# Altium footprint library Stabiliser.PcbLib: 128 footprints (part 1 of 8)
Each footprint in its own frame and in the unit in brackets; x right, y up, seen from the top. Pads: shape width x height; smd on the part's side, far side on the other; paste and mask are expansions set on the pad; w line width, h text height; cw(c..) or ccw(c..) is an arc to the next point about the centre after c.
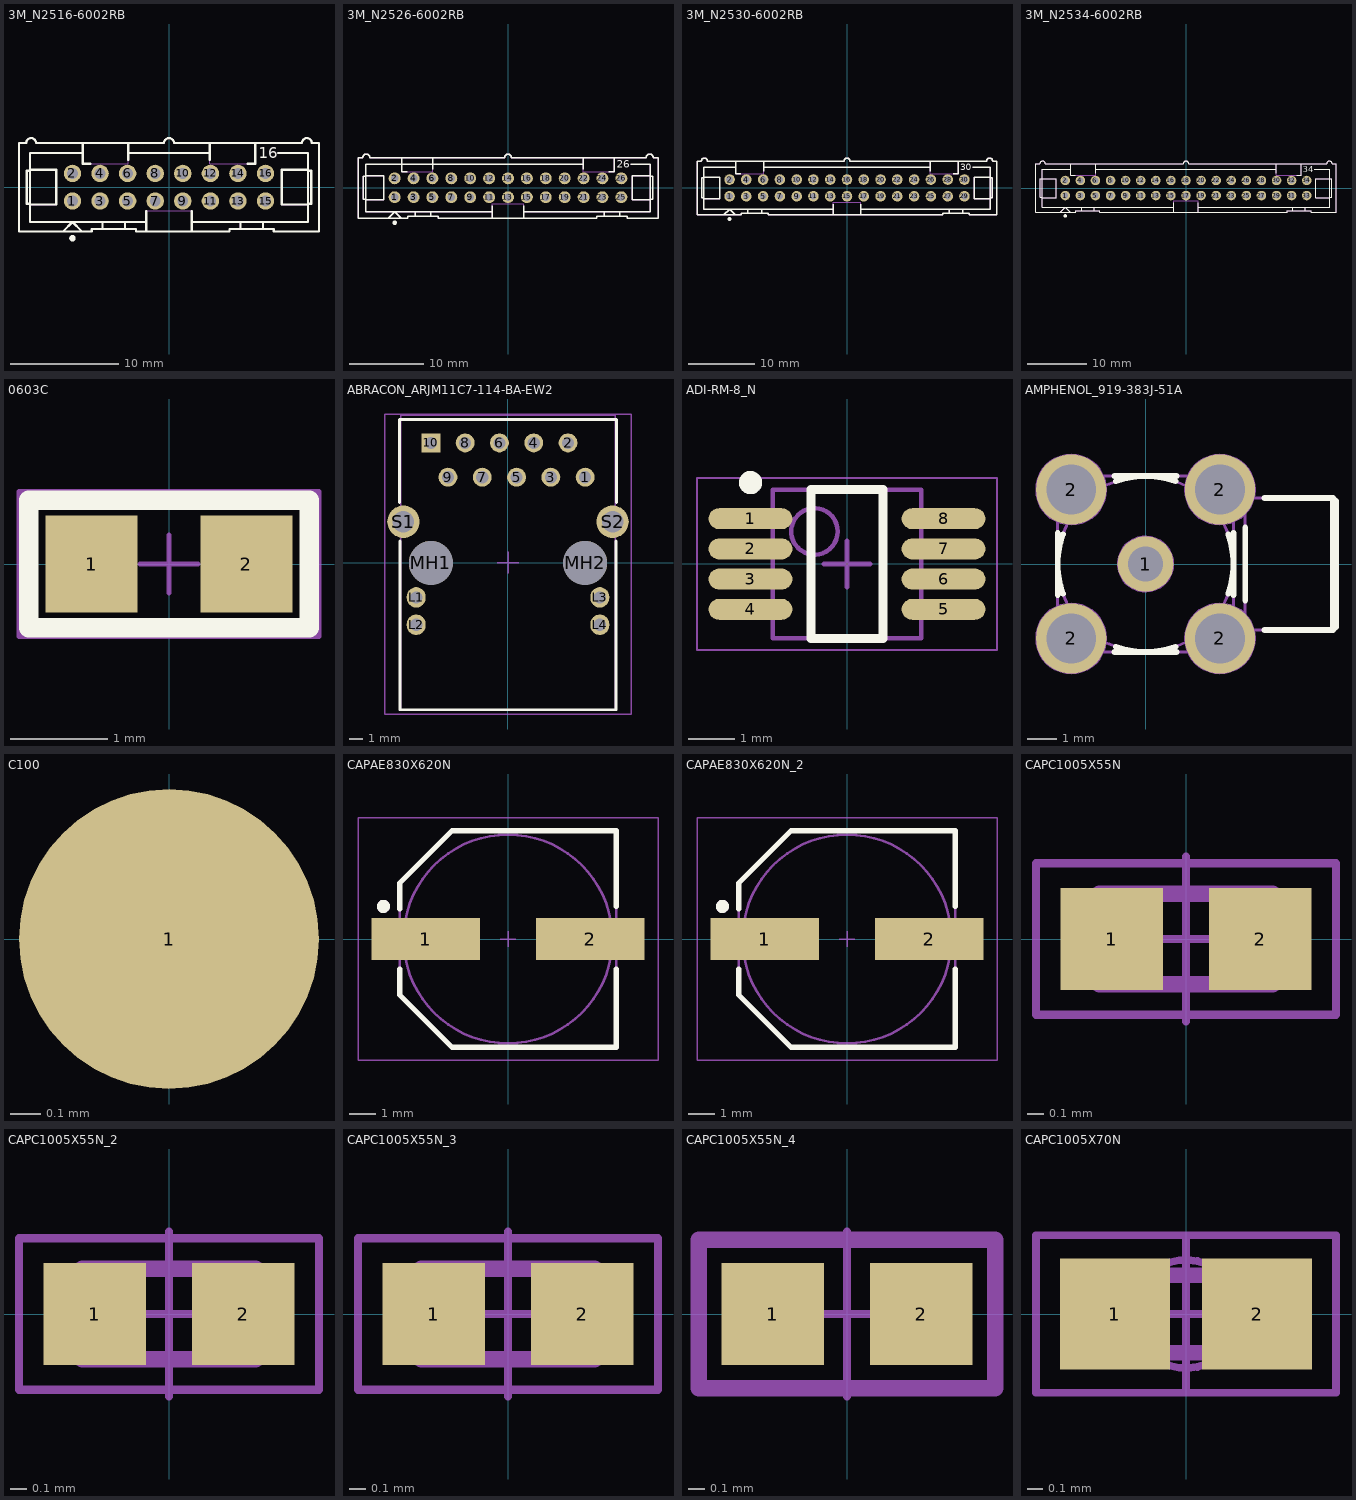
[diagram p0: the footprints below, top view; thin cyan lines are the x and y axes]

## 3M_N2516-6002RB [mm] "16 Contacts - Straight .100\" x .100\" Low Profile Four-Wall Header"
height 9.91
pads (16):
  round 1.6 hole 1: 1(-8.89,-1.27) 2(-8.89,1.27) 3(-6.35,-1.27) 4(-6.35,1.27) 5(-3.81,-1.27) 6(-3.81,1.27) 7(-1.27,-1.27) 8(-1.27,1.27) 9(1.27,-1.27) 10(1.27,1.27) 11(3.81,-1.27) 12(3.81,1.27) 13(6.35,-1.27) 14(6.35,1.27) 15(8.89,-1.27) 16(8.89,1.27)
Top Overlay:
  circle w0.3: c-8.89,-4.699 r0.15
  lines w0.2: -12.802,-1.603 -10.389,-1.603 -10.389,1.603 -12.802,1.603 ; -12.802,-1.524 -13.106,-1.524 -13.106,1.524 -12.802,1.524 ; -9.754,-4.064 -8.89,-3.2 -8.026,-4.064 ; -7.938,3.15 -12.802,3.15 -12.802,-3.2 -2.096,-3.2 ; -7.938,4.064 -7.938,2.159 -7.229,2.159 ; -6.121,-3.835 -6.121,-3.2 ; -4.039,-3.835 -4.039,-3.2 ; -3.747,2.518 -3.747,4.064 ; -3.747,3.15 3.747,3.15 ; -2.096,-4.064 -2.096,-2.209 ; 2.095,-4.064 2.095,-2.209 ; 2.095,-3.2 12.802,-3.2 12.802,3.15 10.033,3.15 ; 3.747,2.518 3.747,4.064 ; 6.579,-3.835 6.579,-3.2 ; 7.229,2.159 7.938,2.159 7.938,4.064 ; 8.661,-3.835 8.661,-3.2 ; 12.802,-1.603 10.389,-1.603 10.389,1.603 12.802,1.603 ; 12.802,-1.524 13.106,-1.524 13.106,1.524 12.802,1.524 ; -13.818,-4.064 -13.818,4.064 -13.157,4.064 cw(c-12.7,4.064) -12.243,4.064 -0.457,4.064 cw(c0,4.064) 0.457,4.064 12.243,4.064 cw(c12.7,4.064) 13.157,4.064 13.818,4.064 13.818,-4.064 9.652,-4.064 9.652,-3.835 5.588,-3.835 5.588,-4.064 -3.048,-4.064 -3.048,-3.835 -7.112,-3.835 -7.112,-4.064 -13.818,-4.064
  text "16" at 8.255,2.667 h1.02
Mechanical 14:
  lines w0.1: -12.802,-1.603 -10.389,-1.603 -10.389,1.603 -12.802,1.603 ; -12.802,-1.524 -13.106,-1.524 -13.106,1.524 -12.802,1.524 ; -9.754,-4.064 -8.89,-3.2 -8.026,-4.064 ; -7.938,3.15 -12.802,3.15 -12.802,-3.2 -2.096,-3.2 ; -7.938,4.064 -7.938,2.159 -3.747,2.159 -3.747,4.064 ; -6.121,-3.835 -6.121,-3.2 ; -4.039,-3.835 -4.039,-3.2 ; -3.747,3.15 3.747,3.15 ; -2.096,-4.064 -2.096,-2.159 2.095,-2.159 2.095,-4.064 ; 2.095,-3.2 12.802,-3.2 12.802,3.15 10.033,3.15 ; 3.747,4.064 3.747,2.159 7.938,2.159 7.938,4.064 ; 6.579,-3.835 6.579,-3.2 ; 8.661,-3.835 8.661,-3.2 ; 12.802,-1.603 10.389,-1.603 10.389,1.603 12.802,1.603 ; 12.802,-1.524 13.106,-1.524 13.106,1.524 12.802,1.524 ; -13.818,-4.064 -13.818,4.064 -13.157,4.064 cw(c-12.7,4.064) -12.243,4.064 -0.457,4.064 cw(c0,4.064) 0.457,4.064 12.243,4.064 cw(c12.7,4.064) 13.157,4.064 13.818,4.064 13.818,-4.064 9.652,-4.064 9.652,-3.835 5.588,-3.835 5.588,-4.064 -3.048,-4.064 -3.048,-3.835 -7.112,-3.835 -7.112,-4.064 -13.818,-4.064
  text "16" at 8.255,2.667 h1.02
3D body "3M_N2516-6002RB.stp": height 9.65, standoff -2.84, extent -13.817,-4.166 13.818,4.521

## 3M_N2526-6002RB [mm] "26 Contacts - Straight .100\" x .100\" Low Profile Four-Wall Header"
height 9.91
pads (26):
  round 1.6 hole 1: 1(-15.24,-1.27) 2(-15.24,1.27) 3(-12.7,-1.27) 4(-12.7,1.27) 5(-10.16,-1.27) 6(-10.16,1.27) 7(-7.62,-1.27) 8(-7.62,1.27) 9(-5.08,-1.27) 10(-5.08,1.27) 11(-2.54,-1.27) 12(-2.54,1.27) 13(0,-1.27) 14(0,1.27) 15(2.54,-1.27) 16(2.54,1.27) 17(5.08,-1.27) 18(5.08,1.27) 19(7.62,-1.27) 20(7.62,1.27) 21(10.16,-1.27) 22(10.16,1.27) 23(12.7,-1.27) 24(12.7,1.27) 25(15.24,-1.27) 26(15.24,1.27)
Top Overlay:
  circle w0.3: c-15.24,-4.699 r0.15
  lines w0.2: -19.152,-1.603 -16.739,-1.603 -16.739,1.603 -19.152,1.603 ; -19.152,-1.524 -19.456,-1.524 -19.456,1.524 -19.152,1.524 ; -16.104,-4.064 -15.24,-3.2 -14.376,-4.064 ; -14.288,3.15 -19.152,3.15 ; -14.288,4.064 -14.288,2.159 -13.579,2.159 ; -12.471,-3.835 -12.471,-3.2 ; -10.389,-3.835 -10.389,-3.2 ; -10.097,2.518 -10.097,4.064 ; -2.096,-4.064 -2.096,-2.438 ; -2.096,-3.2 -19.152,-3.2 -19.152,3.15 ; 2.095,-4.064 2.095,-2.438 ; 2.095,-3.2 19.152,-3.2 19.152,3.15 16.51,3.15 ; 10.097,2.518 10.097,4.064 ; 10.097,3.15 -19.152,3.15 ; 12.929,-3.835 12.929,-3.2 ; 13.579,2.159 14.288,2.159 14.288,4.064 ; 15.011,-3.835 15.011,-3.2 ; 19.152,-1.603 16.739,-1.603 16.739,1.603 19.152,1.603 ; 19.152,-1.524 19.456,-1.524 19.456,1.524 19.152,1.524 ; -20.168,-4.064 -13.462,-4.064 -13.462,-3.835 -9.398,-3.835 -9.398,-4.064 11.938,-4.064 11.938,-3.835 16.002,-3.835 16.002,-4.064 20.168,-4.064 20.168,4.064 19.507,4.064 ccw(c19.05,4.064) 18.593,4.064 0.457,4.064 ccw(c0,4.064) -0.457,4.064 -18.593,4.064 ccw(c-19.05,4.064) -19.507,4.064 -20.168,4.064 -20.168,-4.064
  text "26" at 14.605,2.667 h1.02
Mechanical 14:
  lines w0.1: -19.152,-1.603 -16.739,-1.603 -16.739,1.603 -19.152,1.603 ; -19.152,-1.524 -19.456,-1.524 -19.456,1.524 -19.152,1.524 ; -16.104,-4.064 -15.24,-3.2 -14.376,-4.064 ; -14.288,3.15 -19.152,3.15 ; -14.288,4.064 -14.288,2.159 -10.097,2.159 -10.097,4.064 ; -12.471,-3.835 -12.471,-3.2 ; -10.389,-3.835 -10.389,-3.2 ; -2.096,-4.064 -2.096,-2.159 2.095,-2.159 2.095,-4.064 ; -2.096,-3.2 -19.152,-3.2 -19.152,3.15 ; 2.095,-3.2 19.152,-3.2 19.152,3.15 16.51,3.15 ; 10.097,3.15 -19.152,3.15 ; 10.097,4.064 10.097,2.159 14.288,2.159 14.288,4.064 ; 12.929,-3.835 12.929,-3.2 ; 15.011,-3.835 15.011,-3.2 ; 19.152,-1.603 16.739,-1.603 16.739,1.603 19.152,1.603 ; 19.152,-1.524 19.456,-1.524 19.456,1.524 19.152,1.524 ; -20.168,-4.064 -13.462,-4.064 -13.462,-3.835 -9.398,-3.835 -9.398,-4.064 11.938,-4.064 11.938,-3.835 16.002,-3.835 16.002,-4.064 20.168,-4.064 20.168,4.064 19.507,4.064 ccw(c19.05,4.064) 18.593,4.064 0.457,4.064 ccw(c0,4.064) -0.457,4.064 -18.593,4.064 ccw(c-19.05,4.064) -19.507,4.064 -20.168,4.064 -20.168,-4.064
  text "26" at 14.605,2.667 h1.02
3D body "3M_N2526-6002RB.stp": height 9.91, standoff -2.84, extent -20.167,-4.115 20.168,4.521

## 3M_N2530-6002RB [mm] "30 Contacts - Straight .100\" x .100\" Low Profile Four-Wall Header"
height 9.91
pads (30):
  round 1.6 hole 1: 1(-17.78,-1.27) 2(-17.78,1.27) 3(-15.24,-1.27) 4(-15.24,1.27) 5(-12.7,-1.27) 6(-12.7,1.27) 7(-10.16,-1.27) 8(-10.16,1.27) 9(-7.62,-1.27) 10(-7.62,1.27) 11(-5.08,-1.27) 12(-5.08,1.27) 13(-2.54,-1.27) 14(-2.54,1.27) 15(0,-1.27) 16(0,1.27) 17(2.54,-1.27) 18(2.54,1.27) 19(5.08,-1.27) 20(5.08,1.27) 21(7.62,-1.27) 22(7.62,1.27) 23(10.16,-1.27) 24(10.16,1.27) 25(12.7,-1.27) 26(12.7,1.27) 27(15.24,-1.27) 28(15.24,1.27) 29(17.78,-1.27) 30(17.78,1.27)
Top Overlay:
  circle w0.3: c-17.78,-4.699 r0.15
  lines w0.2: -21.692,-1.603 -19.279,-1.603 -19.279,1.603 -21.692,1.603 ; -21.692,-1.524 -21.996,-1.524 -21.996,1.524 -21.692,1.524 ; -18.644,-4.064 -17.78,-3.2 -16.916,-4.064 ; -16.828,3.15 -21.692,3.15 -21.692,-3.2 -2.096,-3.2 ; -16.828,4.064 -16.828,2.159 -16.119,2.159 ; -15.011,-3.835 -15.011,-3.2 ; -12.929,-3.835 -12.929,-3.2 ; -12.637,2.518 -12.637,4.064 ; -12.637,3.15 12.637,3.15 ; -2.096,-4.064 -2.096,-2.438 ; 2.095,-4.064 2.095,-2.438 ; 2.095,-3.2 21.692,-3.2 21.692,3.15 19.05,3.15 ; 12.637,2.518 12.637,4.064 ; 15.469,-3.835 15.469,-3.2 ; 16.119,2.159 16.828,2.159 16.828,4.064 ; 17.551,-3.835 17.551,-3.2 ; 21.692,-1.603 19.279,-1.603 19.279,1.603 21.692,1.603 ; 21.692,-1.524 21.996,-1.524 21.996,1.524 21.692,1.524 ; -22.708,-4.064 -22.708,4.064 -22.047,4.064 cw(c-21.59,4.064) -21.133,4.064 -0.457,4.064 cw(c0,4.064) 0.457,4.064 21.133,4.064 cw(c21.59,4.064) 22.047,4.064 22.708,4.064 22.708,-4.064 18.542,-4.064 18.542,-3.835 14.478,-3.835 14.478,-4.064 -11.938,-4.064 -11.938,-3.835 -16.002,-3.835 -16.002,-4.064 -22.708,-4.064
  text "30" at 17.145,2.667 h1.02
Mechanical 14:
  lines w0.1: -21.692,-1.603 -19.279,-1.603 -19.279,1.603 -21.692,1.603 ; -21.692,-1.524 -21.996,-1.524 -21.996,1.524 -21.692,1.524 ; -18.644,-4.064 -17.78,-3.2 -16.916,-4.064 ; -16.828,3.15 -21.692,3.15 -21.692,-3.2 -2.096,-3.2 ; -16.828,4.064 -16.828,2.159 -12.637,2.159 -12.637,4.064 ; -15.011,-3.835 -15.011,-3.2 ; -12.929,-3.835 -12.929,-3.2 ; -12.637,3.15 12.637,3.15 ; -2.096,-4.064 -2.096,-2.159 2.095,-2.159 2.095,-4.064 ; 2.095,-3.2 21.692,-3.2 21.692,3.15 19.05,3.15 ; 12.637,4.064 12.637,2.159 16.828,2.159 16.828,4.064 ; 15.469,-3.835 15.469,-3.2 ; 17.551,-3.835 17.551,-3.2 ; 21.692,-1.603 19.279,-1.603 19.279,1.603 21.692,1.603 ; 21.692,-1.524 21.996,-1.524 21.996,1.524 21.692,1.524 ; -22.708,-4.064 -22.708,4.064 -22.047,4.064 cw(c-21.59,4.064) -21.133,4.064 -0.457,4.064 cw(c0,4.064) 0.457,4.064 21.133,4.064 cw(c21.59,4.064) 22.047,4.064 22.708,4.064 22.708,-4.064 18.542,-4.064 18.542,-3.835 14.478,-3.835 14.478,-4.064 -11.938,-4.064 -11.938,-3.835 -16.002,-3.835 -16.002,-4.064 -22.708,-4.064
  text "30" at 17.145,2.667 h1.02
3D body "3M_N2530-6002RB.stp": height 9.91, standoff -2.84, extent -22.707,-4.115 22.708,4.521

## 3M_N2534-6002RB [mm] "34 Contacts - Straight .100\" x .100\" Low Profile Four-Wall Header"
height 9.91
pads (34):
  round 1.6 hole 1: 1(-20.32,-1.27) 2(-20.32,1.27) 3(-17.78,-1.27) 4(-17.78,1.27) 5(-15.24,-1.27) 6(-15.24,1.27) 7(-12.7,-1.27) 8(-12.7,1.27) 9(-10.16,-1.27) 10(-10.16,1.27) 11(-7.62,-1.27) 12(-7.62,1.27) 13(-5.08,-1.27) 14(-5.08,1.27) 15(-2.54,-1.27) 16(-2.54,1.27) 17(0,-1.27) 18(0,1.27) 19(2.54,-1.27) 20(2.54,1.27) 21(5.08,-1.27) 22(5.08,1.27) 23(7.62,-1.27) 24(7.62,1.27) 25(10.16,-1.27) 26(10.16,1.27) 27(12.7,-1.27) 28(12.7,1.27) 29(15.24,-1.27) 30(15.24,1.27) 31(17.78,-1.27) 32(17.78,1.27) 33(20.32,-1.27) 34(20.32,1.27)
Top Overlay:
  circle w0.3: c-20.32,-4.699 r0.15
  lines w0.2: -24.232,-1.603 -21.819,-1.603 -21.819,1.603 -24.232,1.603 ; -24.232,-1.524 -24.536,-1.524 -24.536,1.524 -24.232,1.524 ; -21.184,-4.064 -20.32,-3.2 -19.456,-4.064 ; -19.368,3.15 -24.232,3.15 -24.232,-3.2 -2.096,-3.2 ; -19.368,4.064 -19.368,2.159 -18.659,2.159 ; -17.551,-3.835 -17.551,-3.2 ; -15.469,-3.835 -15.469,-3.2 ; -15.177,2.518 -15.177,4.064 ; -15.177,3.15 15.177,3.15 ; -2.096,-4.064 -2.096,-2.438 ; 2.095,-4.064 2.095,-2.438 ; 2.095,-3.2 24.232,-3.2 24.232,3.15 21.59,3.15 ; 15.177,2.518 15.177,4.064 ; 18.009,-3.835 18.009,-3.2 ; 18.659,2.159 19.368,2.159 19.368,4.064 ; 20.091,-3.835 20.091,-3.2 ; 24.232,-1.603 21.819,-1.603 21.819,1.603 24.232,1.603 ; 24.232,-1.524 24.536,-1.524 24.536,1.524 24.232,1.524 ; -25.248,-4.064 -25.248,4.064 -24.587,4.064 cw(c-24.13,4.064) -23.673,4.064 -0.457,4.064 cw(c0,4.064) 0.457,4.064 23.673,4.064 cw(c24.13,4.064) 24.587,4.064 25.248,4.064 25.248,-4.064 21.082,-4.064 21.082,-3.835 17.018,-3.835 17.018,-4.064 -14.478,-4.064 -14.478,-3.835 -18.542,-3.835 -18.542,-4.064 -25.248,-4.064
  text "34" at 19.685,2.667 h1.02
Mechanical 14:
  lines w0.1: -24.232,-1.603 -21.819,-1.603 -21.819,1.603 -24.232,1.603 ; -24.232,-1.524 -24.536,-1.524 -24.536,1.524 -24.232,1.524 ; -21.184,-4.064 -20.32,-3.2 -19.456,-4.064 ; -19.368,3.15 -24.232,3.15 -24.232,-3.2 -2.096,-3.2 ; -19.368,4.064 -19.368,2.159 -15.177,2.159 -15.177,4.064 ; -17.551,-3.835 -17.551,-3.2 ; -15.469,-3.835 -15.469,-3.2 ; -15.177,3.15 15.177,3.15 ; -2.096,-4.064 -2.096,-2.159 2.095,-2.159 2.095,-4.064 ; 2.095,-3.2 24.232,-3.2 24.232,3.15 21.59,3.15 ; 15.177,4.064 15.177,2.159 19.368,2.159 19.368,4.064 ; 18.009,-3.835 18.009,-3.2 ; 20.091,-3.835 20.091,-3.2 ; 24.232,-1.603 21.819,-1.603 21.819,1.603 24.232,1.603 ; 24.232,-1.524 24.536,-1.524 24.536,1.524 24.232,1.524 ; -25.248,-4.064 -25.248,4.064 -24.587,4.064 cw(c-24.13,4.064) -23.673,4.064 -0.457,4.064 cw(c0,4.064) 0.457,4.064 23.673,4.064 cw(c24.13,4.064) 24.587,4.064 25.248,4.064 25.248,-4.064 21.082,-4.064 21.082,-3.835 17.018,-3.835 17.018,-4.064 -14.478,-4.064 -14.478,-3.835 -18.542,-3.835 -18.542,-4.064 -25.248,-4.064
  text "34" at 19.685,2.667 h1.02
3D body "3M_N2534-6002RB.stp": height 9.91, standoff -2.84, extent -25.247,-4.115 25.248,4.521

## 0603C [mm]
height 10.94
pads (2):
  rect 0.95x1 smd: 1(-0.8,0) 2(0.8,0)
Top Overlay:
  lines w0.203: -1.448,-0.66 -1.448,0.66 1.448,0.66 1.448,-0.66 -1.448,-0.66
Mechanical 14:
  lines w0.1: -1.45,-0.65 -1.45,0.65 1.45,0.65 1.45,-0.65 -1.45,-0.65
Mechanical 15:
  lines w0.05: -0.3,0 0.3,0 ; 0,-0.3 0,0.3 ; -1.55,-0.75 1.55,-0.75 1.55,0.75 -1.55,0.75 -1.55,-0.75
3D body "CAPC1608X87N.stp": height 0.87, standoff 0, extent -0.875,-0.475 0.875,0.475

## ABRACON_ARJM11C7-114-BA-EW2 [mm] "LAN Transformer, body 21.84x15.88mm"
height 13.95
pads (18):
  round 1.4 hole 0.9: 1(5.715,6.35) 2(4.445,8.89) 3(3.175,6.35) 4(1.905,8.89) 5(0.635,6.35) 6(-0.635,8.89) 7(-1.905,6.35) 8(-3.175,8.89) 9(-4.445,6.35)
  rect 1.4x1.4 hole 0.9: 10(-5.715,8.89)
  oval 1.4x1.52 hole 0.9: L1(-6.8,-2.55) L2(-6.8,-4.58) L3(6.8,-2.55) L4(6.8,-4.58)
  round 3.25 hole 3.25 unplated: MH1(-5.715,0) MH2(5.715,0)
  round 2.4 hole 1.6: S1(-7.745,3.05) S2(7.745,3.05)
Top Overlay:
  lines w0.2: -8.04,4.47 -8.04,10.63 8.04,10.63 8.04,4.47 ; -8,1.63 -8,-10.87 8,-10.87 8,1.63
Mechanical 11:
  lines w0.1: -7.94,-10.89 -7.94,10.95 7.94,10.95 7.94,-10.89 -7.94,-10.89
  text ".Designator" at 0,0.03 h1
Mechanical 13:
  lines w0.1: -7.94,-10.89 7.94,-10.89 7.94,10.63 -7.94,10.63 -7.94,-10.89
Mechanical 15:
  lines w0.1: -0.8,0.03 0.8,0.03 ; 0,-0.77 0,0.83 ; -9.145,-11.19 9.145,-11.19 9.145,11.03 -9.145,11.03 -9.145,-11.19
3D body "ARJ11C-MBSAT-A-B-3MU2.STEP": height 16.15, standoff -3.29, extent -10.327,-10.871 10.328,10.63

## ADI-RM-8_N [mm] "SOP, 8-Leads, Body 3x3mm, Pitch 0.65mm, IPC Medium Density"
height 1.1
pads (8):
  oval 1.8x0.45 smd: 1(-2.075,0.975) 2(-2.075,0.325) 3(-2.075,-0.325) 4(-2.075,-0.975) 5(2.075,-0.975) 6(2.075,-0.325) 7(2.075,0.325) 8(2.075,0.975)
Top Overlay:
  circle w0.25: c-2.075,1.75 r0.125
  lines w0.2: -0.775,-1.6 0.775,-1.6 0.775,1.6 -0.775,1.6 -0.775,-1.6
Mechanical 13:
  circle w0.1: c-0.7,0.7 r0.5
  lines w0.1: -1.6,-1.6 1.6,-1.6 1.6,1.6 -1.6,1.6 -1.6,-1.6
Mechanical 15:
  lines w0.05: -3.225,-1.85 3.225,-1.85 3.225,1.85 -3.225,1.85 -3.225,-1.85
  lines w0.1: -0.5,0 0.5,0 ; 0,-0.5 0,0.5
3D body: height 1.1, standoff 0, extent -1.6,-1.6 1.6,1.6

## AMPHENOL_919-383J-51A [mm] "50 Ohm, RF Connector, MCX Right Angle PCB Receptacle Jack"
height 6
pads (5):
  round 1.9 hole 1.2: 1(0,0)
  round 2.4 hole 1.7: 2(-2.54,-2.54) 2(-2.54,2.54) 2(2.54,-2.54) 2(2.54,2.54)
Top Overlay:
  lines w0.2: -3,-1.06 -3,1.06 ; -2.823,-1.016 cw(c0,0) -2.823,1.016 ; -1.06,-3 1.06,-3 ; -1.06,3 1.06,3 ; -1.016,-2.823 ccw(c0,0) 1.016,-2.823 ; -1.016,2.823 cw(c0,0) 1.016,2.823 ; 2.823,-1.016 ccw(c0,0) 2.823,1.016 ; 3,-1.06 3,1.06 ; 3.4,-1.25 3.4,1.25 ; 4.063,-2.25 6.4,-2.25 ; 4.063,2.25 6.4,2.25 ; 6.4,-2.25 6.5,-2.15 6.5,2.15 6.4,2.25 ; 6.4,-2.25 6.4,2.25
Mechanical 8:
  circle w0.05: c0,0 r0.6
  circle w0.05: c0,0 r0.95
  circle w0.05: c-2.54,-2.54 r0.85
  circle w0.05: c-2.54,-2.54 r1.2
  circle w0.05: c2.54,2.54 r0.85
  circle w0.05: c2.54,2.54 r1.2
  circle w0.05: c-2.54,2.54 r0.85
  circle w0.05: c-2.54,2.54 r1.2
  circle w0.05: c2.54,-2.54 r0.85
  circle w0.05: c2.54,-2.54 r1.2
  lines w0.1: -3.04,-2.54 -2.54,-2.54 ; -3.04,2.54 -2.54,2.54 ; -2.54,-3.04 -2.54,-2.54 ; -2.54,-2.04 -2.54,-2.54 ; -2.54,2.04 -2.54,2.54 ; -2.54,3.04 -2.54,2.54 ; -2.04,-2.54 -2.54,-2.54 ; -2.04,2.54 -2.54,2.54 ; -0.5,0 0,0 ; 0,-0.5 0,0 ; 0,0.5 0,0 ; 0.5,0 0,0 ; 2.04,-2.54 2.54,-2.54 ; 2.04,2.54 2.54,2.54 ; 2.54,-3.04 2.54,-2.54 ; 2.54,-2.04 2.54,-2.54 ; 2.54,2.04 2.54,2.54 ; 2.54,3.04 2.54,2.54 ; 3.04,-2.54 2.54,-2.54 ; 3.04,2.54 2.54,2.54
Mechanical 14:
  circle w0.1: c0,0 r3
  lines w0.1: 3,-2.6 3.4,-2.6 3.4,2.6 3,2.6 ; 3.4,-2.25 6.4,-2.25 ; 3.4,2.25 6.4,2.25 ; 6.4,-2.25 6.5,-2.15 6.5,2.15 6.4,2.25 ; 6.4,-2.25 6.4,2.25 ; -3,-3 3,-3 3,3 -3,3 -3,-3
3D body "AMPHENOL_919-383J-51A.stp": height 6, standoff -3.94, extent -3,-3 6.5,3

## C100 [mm] "1mm Diameter SMD Pad"
height 25.8
pads (1):
  round 1 smd paste-1: 1(0,0)

## CAPAE830X620N [mm] "Capacitor, Aluminium Electrolytric, 8.3mm L X 8.3mm W X 6.2mm H, IPC Medium Density"
height 6.2
pads (2):
  rect 4.15x1.6 smd: 1(-3.15,0) 2(3.15,0)
Top Overlay:
  circle w0.25: c-4.775,1.25 r0.125
  lines w0.2: -4.15,-1.15 -4.15,-2.15 -2.15,-4.15 4.15,-4.15 4.15,-1.15 ; -4.15,1.15 -4.15,2.15 -2.15,4.15 4.15,4.15 4.15,1.25
Mechanical 14:
  circle w0.25: c-4.774,1.251 r0.125
  circle w0.1: c0,0 r4
  lines w0.1: -4.15,-2.15 -2.15,-4.15 4.15,-4.15 4.15,4.15 -2.15,4.15 -4.15,2.15 -4.15,-2.15
Mechanical 15:
  lines w0.05: -0.3,0 0.3,0 ; 0,-0.3 0,0.3 ; -5.75,-4.65 -5.75,4.65 5.75,4.65 5.75,-4.65 -5.75,-4.65
3D body "CAPAE830X620N.stp": height 6.2, standoff 0, extent -4.75,-4.25 4.75,4.25

## CAPAE830X620N_2 [mm]
pads (2):
  rect 4.15x1.6 smd: 1(-3.15,0) 2(3.15,0)
Top Overlay:
  circle w0.25: c-4.775,1.25 r0.125
  lines w0.2: -4.15,-1.15 -4.15,-2.15 -2.15,-4.15 4.15,-4.15 4.15,-1.15 ; -4.15,1.15 -4.15,2.15 -2.15,4.15 4.15,4.15 4.15,1.25
Mechanical 14:
  circle w0.25: c-4.774,1.251 r0.125
  circle w0.1: c0,0 r4
  lines w0.1: -4.15,-2.15 -2.15,-4.15 4.15,-4.15 4.15,4.15 -2.15,4.15 -4.15,2.15 -4.15,-2.15
Mechanical 15:
  lines w0.05: -0.3,0 0.3,0 ; 0,-0.3 0,0.3 ; -5.75,-4.65 -5.75,4.65 5.75,4.65 5.75,-4.65 -5.75,-4.65
3D body "CAPAE830X620N.stp": height 6.2, standoff 0, extent -4.75,-4.25 4.75,4.25

## CAPC1005X55N [mm] "Capacitor, Non-Polarized, Chip; 1.00mm L X 0.50mm W X 0.70mm H, IPC Medium Density"
height 0.55
pads (2):
  rect 0.62x0.62 smd: 1(-0.45,0) 2(0.45,0)
Mechanical 14:
  lines w0.1: -0.525,-0.275 0.525,-0.275 0.525,0.275 -0.525,0.275 -0.525,-0.275
Mechanical 15:
  lines w0.05: -0.5,0 0.5,0 ; 0,-0.5 0,0.5 ; -0.91,-0.46 0.91,-0.46 0.91,0.46 -0.91,0.46 -0.91,-0.46
3D body "CAPC1005X55N.stp": height 0.55, standoff 0, extent -0.525,-0.275 0.525,0.275

## CAPC1005X55N_2 [mm]
pads (2):
  rect 0.62x0.62 smd: 1(-0.45,0) 2(0.45,0)
Mechanical 14:
  lines w0.1: -0.525,-0.275 0.525,-0.275 0.525,0.275 -0.525,0.275 -0.525,-0.275
Mechanical 15:
  lines w0.05: -0.5,0 0.5,0 ; 0,-0.5 0,0.5 ; -0.91,-0.46 0.91,-0.46 0.91,0.46 -0.91,0.46 -0.91,-0.46
3D body "CAPC1005X55N.stp": height 0.55, standoff 0, extent -0.525,-0.275 0.525,0.275

## CAPC1005X55N_3 [mm]
pads (2):
  rect 0.62x0.62 smd: 1(-0.45,0) 2(0.45,0)
Mechanical 14:
  lines w0.1: -0.525,-0.275 -0.525,0.275 0.525,0.275 0.525,-0.275 -0.525,-0.275
Mechanical 15:
  lines w0.05: -0.5,0 0.5,0 ; 0,-0.5 0,0.5 ; -0.91,-0.46 -0.91,0.46 0.91,0.46 0.91,-0.46 -0.91,-0.46
3D body "CAPC1005X55N.stp": height 0.55, standoff 0, extent -0.525,-0.275 0.525,0.275

## CAPC1005X55N_4 [mm]
pads (2):
  rect 0.62x0.62 smd: 1(-0.45,0) 2(0.45,0)
Mechanical 14:
  lines w0.1: -0.9,-0.45 -0.9,0.45 0.9,0.45 0.9,-0.45 -0.9,-0.45
Mechanical 15:
  lines w0.05: -0.5,0 0.5,0 ; 0,-0.5 0,0.5 ; -0.91,-0.46 -0.91,0.46 0.91,0.46 0.91,-0.46 -0.91,-0.46
3D body "CAPC1005X55N.stp": height 0.55, standoff 0, extent -0.525,-0.275 0.525,0.275

## CAPC1005X70N [mm] "Capacitor, Non-Polarized, Chip; 1.00mm L X 0.50mm W X 0.70mm H, IPC Medium Density"
height 0.7
pads (2):
  rect 0.71x0.72 smd: 1(-0.46,0) 2(0.46,0)
Mechanical 14:
  lines w0.1: -0.5,-0.25 -0.5,0.25 0.5,0.25 0.5,-0.25 -0.5,-0.25
Mechanical 15:
  circle w0.05: c0,0 r0.35
  lines w0.05: -0.5,0 0.5,0 ; 0,-0.5 0,0.5 ; -0.97,-0.51 -0.97,0.51 0.97,0.51 0.97,-0.51 -0.97,-0.51
3D body "CAPC1005X70N.stp": height 0.7, standoff 0, extent -0.6,-0.35 0.6,0.35